# Altium footprint library Intelliclone.PcbLib: 372 footprints (part 13 of 24)
Each footprint in its own frame and in the unit in brackets; x right, y up, seen from the top. Pads: shape width x height; smd on the part's side, far side on the other; paste and mask are expansions set on the pad; w line width, h text height; cw(c..) or ccw(c..) is an arc to the next point about the centre after c.
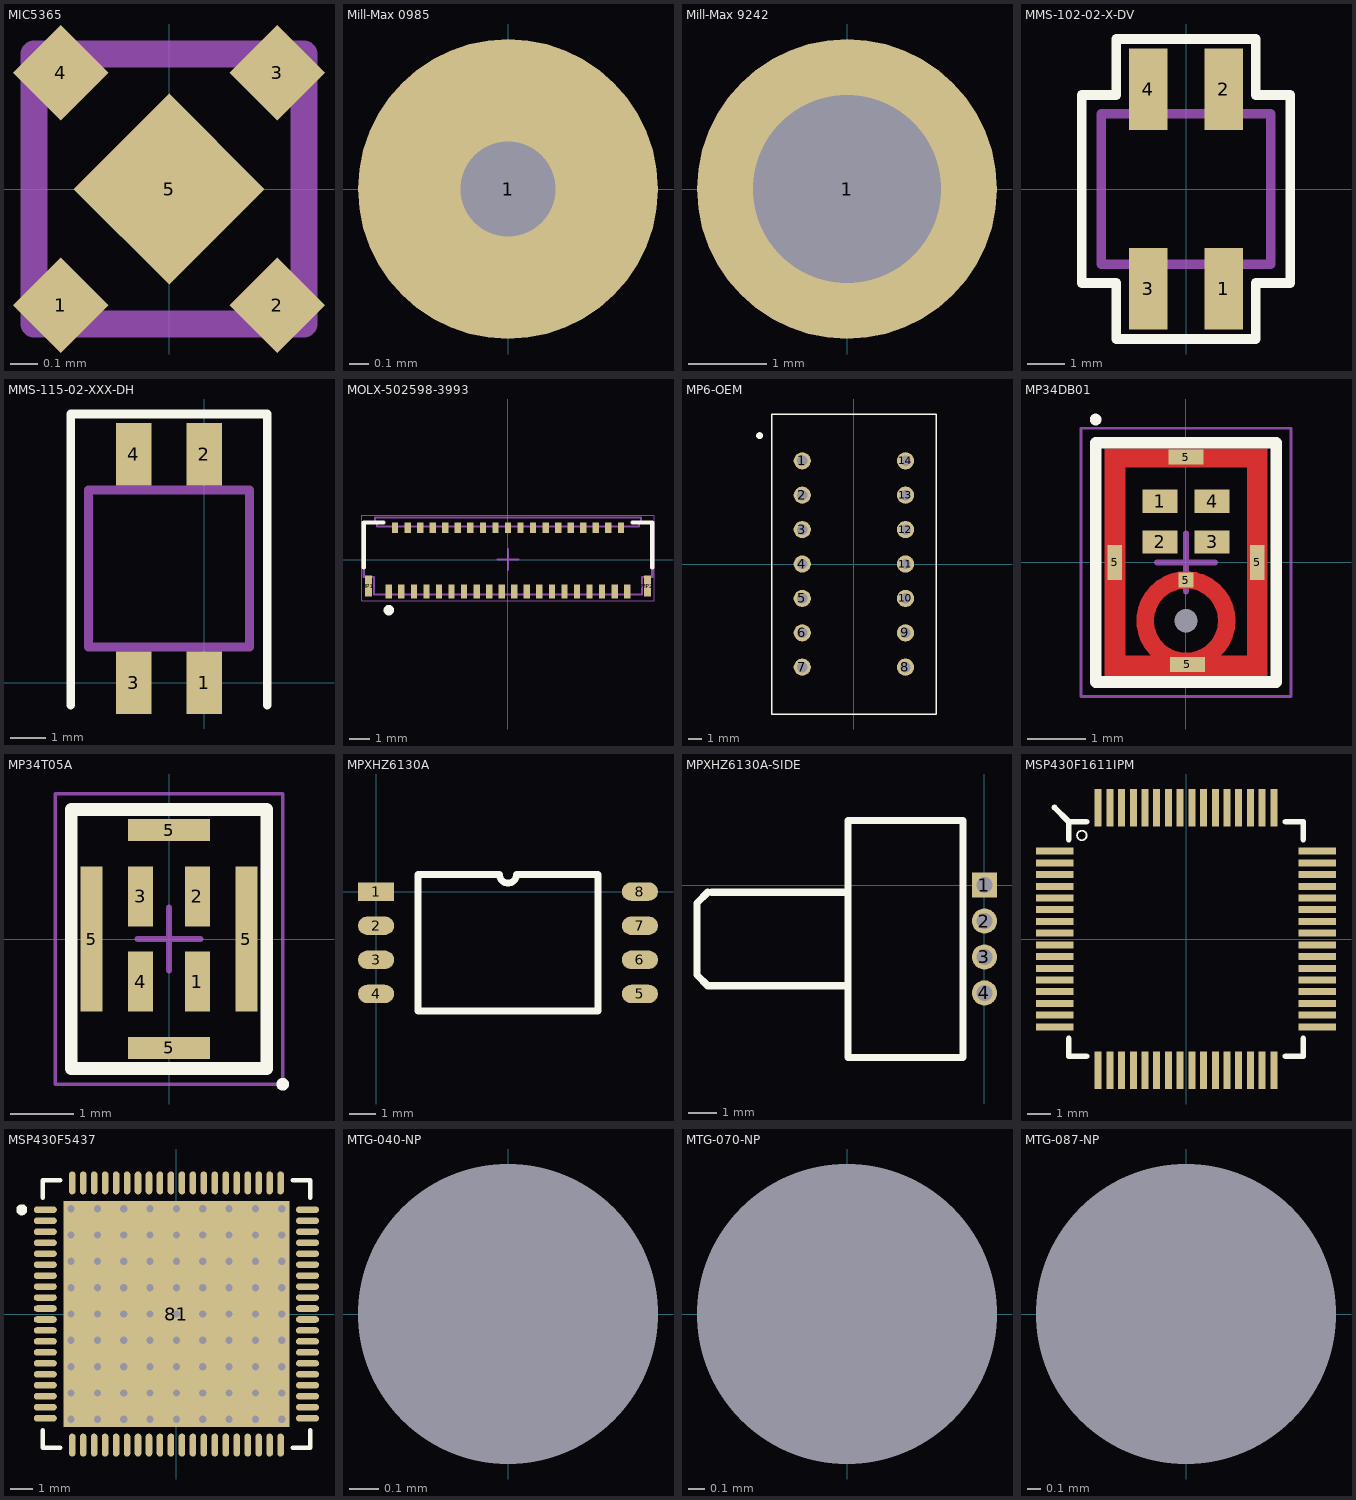
[diagram p12: the footprints below, top view; thin cyan lines are the x and y axes]

## MIC5365 [mm]
pads (5):
  rrect0% 0.25x0.25 smd rot 45: 1(-0.4,-0.43) 2(0.4,-0.43) 3(0.4,0.43) 4(-0.4,0.43)
  rrect0% 0.5x0.5 smd rot 45: 5(0,0)
Mechanical 1:
  lines w0.1: -0.5,-0.5 0.5,-0.5 0.5,0.5 -0.5,0.5 -0.5,-0.5
  text "U2" at 1.664,0.375 h0.51

## Mill-Max 0985 [mil] "CONTACT SPRING LOADED T/H GOLD"
pads (1):
  round 60 hole 19: 1(0,0)
3D body "mill-max-0985-0-15-20-71-14-11-0.step": height 247, standoff -103, extent -21.49,-21.49 21.51,21.51

## Mill-Max 9242 [mil] "CONN PC PIN CIRC .083 DIA TIN"
pads (1):
  round 150 hole 94: 1(0,0)
3D body "mill-max-9242-0-00-01-00-00-08-0.step": height 400, standoff -94, extent -62.49,-62.49 62.51,62.51

## MMS-102-02-X-DV [mm] "Samtec MMS-102-02-X-DV"
pads (4):
  rect 1.02x2.16 smd mask+0.05: 1(1,-2.655) 2(1,2.655) 3(-1,-2.655) 4(-1,2.655)
Top Overlay:
  lines w0.254: -2.775,-2.5 -2.775,2.5 -1.85,2.5 -1.85,3.989 1.85,3.989 1.85,2.5 2.775,2.5 2.775,-2.5 1.85,-2.5 1.85,-3.989 -1.85,-3.989 -1.85,-2.5 -2.775,-2.5
Mechanical 1:
  lines w0.254: -2.25,-2 -2.25,2 2.25,2 2.25,-2 -2.25,-2
3D body "MMS-102-02-S-DV-TR.stp": height 4.44, standoff -0.05, extent -2.278,-3.218 2.279,3.218

## MMS-115-02-XXX-DH [mil]
pads (4):
  rect 40x70 smd mask+2: 1(0,0) 2(0,255) 3(-78.74,0) 4(-78.74,255)
Top Overlay:
  lines w10: -149.09,-25 -149.09,300 70.37,300 70.37,-25
Mechanical 1:
  lines w10: -129.09,40 50.37,40 50.37,215 -129.09,215 -129.09,40
  text "J1" at -51.18,118.11 h30
3D body "MMS-102-02-S-DH.stp": height 165.27, standoff 0.87, extent -129.69,-14.99 49.71,270.01

## MOLX-502598-3993 [mm] "FPC Connector, 39-Leads, Right Angle, Pitch 0.3 mm, Mated Height 1.15 mm, SMT"
height 1.162
pads (41):
  rect 0.3x0.67 smd: 1(-5.7,-1.532) 3(-5.1,-1.532) 5(-4.5,-1.532) 7(-3.9,-1.532) 9(-3.3,-1.532) 11(-2.7,-1.532) 13(-2.1,-1.532) 15(-1.5,-1.532) 17(-0.9,-1.532) 19(-0.3,-1.532) 21(0.3,-1.532) 23(0.9,-1.532) 25(1.5,-1.532) 27(2.1,-1.532) 29(2.7,-1.532) 31(3.3,-1.532) 33(3.9,-1.532) 35(4.5,-1.532) 37(5.1,-1.532) 39(5.7,-1.532)
  rect 0.3x0.5 smd: 2(-5.4,1.533) 4(-4.8,1.533) 6(-4.2,1.533) 8(-3.6,1.533) 10(-3,1.533) 12(-2.4,1.533) 14(-1.8,1.533) 16(-1.2,1.533) 18(-0.6,1.533) 20(0,1.533) 22(0.6,1.533) 24(1.2,1.533) 26(1.8,1.533) 28(2.4,1.533) 30(3,1.533) 32(3.6,1.533) 34(4.2,1.533) 36(4.8,1.533) 38(5.4,1.533)
  rect 0.35x1 smd: MP1(-6.675,-1.267) MP2(6.675,-1.267)
Top Overlay:
  circle w0.25: c-5.7,-2.417 r0.125
  lines w0.2: -6.9,-0.37 -6.9,1.775 -5.95,1.775 ; 5.95,1.775 6.9,1.775 6.9,-0.37
Mechanical 13:
  lines w0.1: -6.37,1.775 -6.37,2.025 6.37,2.025 6.37,1.775 ; 6.27,1.775 6.9,1.775 ; 6.27,1.775 6.27,1.575 -6.27,1.575 -6.27,1.775 -6.9,1.775 -6.9,-0.825 -6.4,-0.825 -6.4,-1.667 6.4,-1.667 6.4,-0.825 6.9,-0.825 6.9,1.775
Mechanical 15:
  lines w0.05: -7,-1.967 -7,2.125 7,2.125 7,-1.967 -7,-1.967
  lines w0.1: -0.5,0 0.5,0 ; 0,-0.5 0,0.5
3D body "5025983993.stp": height 1.16, standoff 0.01, extent -6.9,-1.775 6.9,2.025

## MP6-OEM [mil] "MP6 Pump Driver Module"
pads (14):
  round 50 hole 30: 1(-150,300) 2(-150,200) 3(-150,100) 4(-150,0) 5(-150,-100) 6(-150,-200) 7(-150,-300) 8(150,-300) 9(150,-200) 10(150,-100) 11(150,0) 12(150,100) 13(150,200) 14(150,300)
Top Overlay:
  circle w10: c-274,373 r5
  lines w4.02: -239,-436 -239,436 239,436 239,-436 -239,-436
3D body: height 230, standoff 4, extent -239,-436 239,436

## MP34DB01 [mm] "DFN, 4-Leads, Body 4.00x3.00mm, Pitch 0.70mm, IPC Medium Density"
height 1
pads (10):
  round 0 hole 0.4 unplated: 0(0,-1)
  rect 0.6x0.4 smd: 1(-0.45,1.05) 2(-0.45,0.35) 3(0.45,0.35) 4(0.45,1.05)
  rect 0.254x0.6 smd paste-3 mask-3: 5(-1.222,0) 5(1.222,0)
  rect 0.254x0.254 smd paste-3 mask-3: 5(0,-0.302)
  rect 0.6x0.254 smd paste-3 mask-3: 5(0,1.806) 5(0.025,-1.75)
Top Layer:
  circle w0.3: c0,-1 r0.7
  rectangle: 1.048,-1.95 1.4,1.95
  rectangle: -1.4,-1.95 1.4,-1.6
  rectangle: -1.4,-1.95 -1.041,1.95
  rectangle: -1.4,1.629 1.4,1.95
  rectangle: -0.711,1.625 0.7,1.95
  rectangle: 1.05,-1.95 1.4,1.139
  rectangle: -1.394,-1.951 -1.044,1.146
Top Overlay:
  circle w0.1: c-1.55,2.45 r0.05
  lines w0.2: -1.55,-2.05 -1.55,2.05 1.55,2.05 1.55,-2.05 -1.55,-2.05
Top Paste:
  rectangle: 1.051,0.947 1.401,1.163
  rectangle: -1.406,0.95 -1.056,1.167
  region: -0.8,-1.6 -0.8,-1.95 0.85,-1.95 0.85,-1.6
  region: 1.4,-1.25 1.05,-1.25 1.05,-1.95 1.4,-1.95
  region: -1.05,-1.25 -1.4,-1.25 -1.4,-1.95 -1.05,-1.95
  region: 0.752,1.625 0.752,1.95 -0.763,1.95 -0.763,1.625
  rectangle: 1.052,0.95 1.4,1.95
  rectangle: -1.415,0.95 -1.052,1.95
  rectangle: 1.05,-0.65 1.4,0.65
  rectangle: -1.4,-0.65 -1.05,0.65
  lines w0.3: -0.696,-1.072 cw(c0,-1) -0.282,-0.359 ; -0.482,-1.508 ccw(c0,-1) 0.525,-1.463 ; 0.293,-0.364 cw(c0,-1) 0.697,-1.061
Mechanical 13:
  lines w0.1: -1.55,-2.05 1.55,-2.05 1.55,2.05 -1.55,2.05 -1.55,-2.05
Mechanical 15:
  lines w0.05: -1.8,-2.3 1.8,-2.3 1.8,2.3 -1.8,2.3 -1.8,-2.3
  lines w0.1: -0.5,0 0.5,0 ; 0,-0.5 0,0.5
3D body: height 1, standoff 0.05, extent -1.55,-2.05 1.55,2.05

## MP34T05A [mm]
pads (8):
  rect 0.4x0.95 smd: 1(0.45,-0.675) 2(0.45,0.675) 3(-0.45,0.675) 4(-0.45,-0.675)
  rect 0.35x2.3 smd: 5(-1.225,0) 5(1.225,0)
  rect 1.3x0.35 smd: 5(0,-1.725) 5(0,1.725)
Top Overlay:
  circle w0.1: c1.8,-2.3 r0.05
  lines w0.2: -1.55,-2.05 1.55,-2.05 1.55,2.05 -1.55,2.05 -1.55,-2.05
Mechanical 13:
  lines w0.1: -1.55,-2.05 -1.55,2.05 1.55,2.05 1.55,-2.05 -1.55,-2.05
Mechanical 15:
  lines w0.05: -1.8,-2.3 -1.8,2.3 1.8,2.3 1.8,-2.3 -1.8,-2.3
  lines w0.1: -0.5,0 0.5,0 ; 0,-0.5 0,0.5
3D body: height 1, standoff 0.05, extent -1.55,-2.05 1.55,2.05

## MPXHZ6130A [mil] "SENSOR PRESSURE AXIAL PORT 8SSOP"
pads (8):
  rect 53x27 smd: 1(0,0)
  oval 53x27 smd: 2(0,-50) 3(0,-100) 4(0,-150) 5(387,-150) 6(387,-100) 7(387,-50) 8(387,0)
Top Overlay:
  lines w10: 61.5,-175 325.5,-175 325.5,25 206,25 cw(c193.5,25) 181,25 61.5,25 61.5,-175

## MPXHZ6130A-SIDE [mil] "SENSOR PRESSURE AXIAL PORT 8SSOP - 90 Degrees"
pads (4):
  rect 35x35 hole 22: 1(0,0)
  round 35 hole 22: 2(0,-50) 3(0,-100) 4(0,-150)
Top Overlay:
  lines w10: -385,-10 -400,-25 -400,-125 -385,-140 -380,-140 -190,-140 ; -380,-10 -190,-10 ; -190,-240 -30,-240 -30,90 -190,90 -190,-240
3D body: height 335, standoff 0, extent -188.98,-240.16 -27.56,90.55
3D body: height 119.53, standoff 0, extent -382.4,-135.51 -192.4,-15.75

## MSP430F1611IPM [mil]
pads (64):
  rect 63x11.8 smd: 1(-220.5,147.6) 2(-220.5,128) 3(-220.5,108.3) 4(-220.5,88.6) 5(-220.5,68.9) 6(-220.5,49.2) 7(-220.5,29.5) 8(-220.5,9.8) 9(-220.5,-9.8) 10(-220.5,-29.5) 11(-220.5,-49.2) 12(-220.5,-68.9) 13(-220.5,-88.6) 14(-220.5,-108.3) 15(-220.5,-128) 16(-220.5,-147.6) 33(220.5,-147.6) 34(220.5,-128) 35(220.5,-108.3) 36(220.5,-88.6) 37(220.5,-68.9) 38(220.5,-49.2) 39(220.5,-29.5) 40(220.5,-9.8) 41(220.5,9.8) 42(220.5,29.5) 43(220.5,49.2) 44(220.5,68.9) 45(220.5,88.6) 46(220.5,108.3) 47(220.5,128) 48(220.5,147.6)
  rect 11.8x63 smd: 17(-147.6,-220.5) 18(-128,-220.5) 19(-108.3,-220.5) 20(-88.6,-220.5) 21(-68.9,-220.5) 22(-49.2,-220.5) 23(-29.5,-220.5) 24(-9.8,-220.5) 25(9.8,-220.5) 26(29.5,-220.5) 27(49.2,-220.5) 28(68.9,-220.5) 29(88.6,-220.5) 30(108.3,-220.5) 31(128,-220.5) 32(147.6,-220.5) 49(147.6,220.5) 50(128,220.5) 51(108.3,220.5) 52(88.6,220.5) 53(68.9,220.5) 54(49.2,220.5) 55(29.5,220.5) 56(9.8,220.5) 57(-9.8,220.5) 58(-29.5,220.5) 59(-49.2,220.5) 60(-68.9,220.5) 61(-88.6,220.5) 62(-108.3,220.5) 63(-128,220.5) 64(-147.6,220.5)
Top Overlay:
  circle w3: c-174.92,174 r8
  lines w9.8: -197,-167 -197,-197 -167,-197 ; -197,167 -197,197 -167,197 ; 167,-197 197,-197 197,-167 ; 167,197 197,197 197,167
  lines w10: -221,221 -197.73,197.73
3D body: height 55.11, standoff 4, extent -198,-196 198,196

## MSP430F5437 [mm]
pads (81):
  oval 1.05x0.3 smd: 1(-5.975,4.75) 2(-5.975,4.25) 3(-5.975,3.75) 4(-5.975,3.25) 5(-5.975,2.75) 6(-5.975,2.25) 7(-5.975,1.75) 8(-5.975,1.25) 9(-5.975,0.75) 10(-5.975,0.25) 11(-5.975,-0.25) 12(-5.975,-0.75) 13(-5.975,-1.25) 14(-5.975,-1.75) 15(-5.975,-2.25) 16(-5.975,-2.75) 17(-5.975,-3.25) 18(-5.975,-3.75) 19(-5.975,-4.25) 20(-5.975,-4.75) 41(5.975,-4.75) 42(5.975,-4.25) 43(5.975,-3.75) 44(5.975,-3.25) 45(5.975,-2.75) 46(5.975,-2.25) 47(5.975,-1.75) 48(5.975,-1.25) 49(5.975,-0.75) 50(5.975,-0.25) 51(5.975,0.25) 52(5.975,0.75) 53(5.975,1.25) 54(5.975,1.75) 55(5.975,2.25) 56(5.975,2.75) 57(5.975,3.25) 58(5.975,3.75) 59(5.975,4.25) 60(5.975,4.75)
  oval 0.3x1.05 smd: 21(-4.75,-5.975) 22(-4.25,-5.975) 23(-3.75,-5.975) 24(-3.25,-5.975) 25(-2.75,-5.975) 26(-2.25,-5.975) 27(-1.75,-5.975) 28(-1.25,-5.975) 29(-0.75,-5.975) 30(-0.25,-5.975) 31(0.25,-5.975) 32(0.75,-5.975) 33(1.25,-5.975) 34(1.75,-5.975) 35(2.25,-5.975) 36(2.75,-5.975) 37(3.25,-5.975) 38(3.75,-5.975) 39(4.25,-5.975) 40(4.75,-5.975) 61(4.75,5.975) 62(4.25,5.975) 63(3.75,5.975) 64(3.25,5.975) 65(2.75,5.975) 66(2.25,5.975) 67(1.75,5.975) 68(1.25,5.975) 69(0.75,5.975) 70(0.25,5.975) 71(-0.25,5.975) 72(-0.75,5.975) 73(-1.25,5.975) 74(-1.75,5.975) 75(-2.25,5.975) 76(-2.75,5.975) 77(-3.25,5.975) 78(-3.75,5.975) 79(-4.25,5.975) 80(-4.75,5.975)
  rect 10.3x10.3 smd: 81(0,0)
via -4.8,4.8 diameter 0.66 hole 0.33
via -3.6,4.8 diameter 0.66 hole 0.33
via -2.4,4.8 diameter 0.66 hole 0.33
via -1.2,4.8 diameter 0.66 hole 0.33
via 0,4.8 diameter 0.66 hole 0.33
via 1.2,4.8 diameter 0.66 hole 0.33
via 2.4,4.8 diameter 0.66 hole 0.33
via 3.6,4.8 diameter 0.66 hole 0.33
via 4.8,4.8 diameter 0.66 hole 0.33
via -4.8,3.6 diameter 0.66 hole 0.33
via -3.6,3.6 diameter 0.66 hole 0.33
via -2.4,3.6 diameter 0.66 hole 0.33
via -1.2,3.6 diameter 0.66 hole 0.33
via 0,3.6 diameter 0.66 hole 0.33
via 1.2,3.6 diameter 0.66 hole 0.33
via 2.4,3.6 diameter 0.66 hole 0.33
via 3.6,3.6 diameter 0.66 hole 0.33
via 4.8,3.6 diameter 0.66 hole 0.33
via -4.8,2.4 diameter 0.66 hole 0.33
via -3.6,2.4 diameter 0.66 hole 0.33
via -2.4,2.4 diameter 0.66 hole 0.33
via -1.2,2.4 diameter 0.66 hole 0.33
via 0,2.4 diameter 0.66 hole 0.33
via 1.2,2.4 diameter 0.66 hole 0.33
via 2.4,2.4 diameter 0.66 hole 0.33
via 3.6,2.4 diameter 0.66 hole 0.33
via 4.8,2.4 diameter 0.66 hole 0.33
via -4.8,1.2 diameter 0.66 hole 0.33
via -3.6,1.2 diameter 0.66 hole 0.33
via -2.4,1.2 diameter 0.66 hole 0.33
via -1.2,1.2 diameter 0.66 hole 0.33
via 0,1.2 diameter 0.66 hole 0.33
via 1.2,1.2 diameter 0.66 hole 0.33
via 2.4,1.2 diameter 0.66 hole 0.33
via 3.6,1.2 diameter 0.66 hole 0.33
via 4.8,1.2 diameter 0.66 hole 0.33
via -4.8,0 diameter 0.66 hole 0.33
via -3.6,0 diameter 0.66 hole 0.33
via -2.4,0 diameter 0.66 hole 0.33
via -1.2,0 diameter 0.66 hole 0.33
via 0,0 diameter 0.66 hole 0.33
via 1.2,0 diameter 0.66 hole 0.33
via 2.4,0 diameter 0.66 hole 0.33
via 3.6,0 diameter 0.66 hole 0.33
via 4.8,0 diameter 0.66 hole 0.33
via -4.8,-1.2 diameter 0.66 hole 0.33
via -3.6,-1.2 diameter 0.66 hole 0.33
via -2.4,-1.2 diameter 0.66 hole 0.33
via -1.2,-1.2 diameter 0.66 hole 0.33
via 0,-1.2 diameter 0.66 hole 0.33
via 1.2,-1.2 diameter 0.66 hole 0.33
via 2.4,-1.2 diameter 0.66 hole 0.33
via 3.6,-1.2 diameter 0.66 hole 0.33
via 4.8,-1.2 diameter 0.66 hole 0.33
via -4.8,-2.4 diameter 0.66 hole 0.33
via -3.6,-2.4 diameter 0.66 hole 0.33
via -2.4,-2.4 diameter 0.66 hole 0.33
via -1.2,-2.4 diameter 0.66 hole 0.33
via 0,-2.4 diameter 0.66 hole 0.33
via 1.2,-2.4 diameter 0.66 hole 0.33
via 2.4,-2.4 diameter 0.66 hole 0.33
via 3.6,-2.4 diameter 0.66 hole 0.33
via 4.8,-2.4 diameter 0.66 hole 0.33
via -4.8,-3.6 diameter 0.66 hole 0.33
via -3.6,-3.6 diameter 0.66 hole 0.33
via -2.4,-3.6 diameter 0.66 hole 0.33
via -1.2,-3.6 diameter 0.66 hole 0.33
via 0,-3.6 diameter 0.66 hole 0.33
via 1.2,-3.6 diameter 0.66 hole 0.33
via 2.4,-3.6 diameter 0.66 hole 0.33
via 3.6,-3.6 diameter 0.66 hole 0.33
via 4.8,-3.6 diameter 0.66 hole 0.33
via -4.8,-4.8 diameter 0.66 hole 0.33
via -3.6,-4.8 diameter 0.66 hole 0.33
via -2.4,-4.8 diameter 0.66 hole 0.33
via -1.2,-4.8 diameter 0.66 hole 0.33
via 0,-4.8 diameter 0.66 hole 0.33
via 1.2,-4.8 diameter 0.66 hole 0.33
via 2.4,-4.8 diameter 0.66 hole 0.33
via 3.6,-4.8 diameter 0.66 hole 0.33
via 4.8,-4.8 diameter 0.66 hole 0.33
Top Overlay:
  circle w0.25: c-7.05,4.75 r0.125
  lines w0.2: -6.1,-5.3 -6.1,-6.1 -5.3,-6.1 ; -6.1,5.3 -6.1,6.1 -5.3,6.1 ; 5.3,-6.1 6.1,-6.1 6.1,-5.3 ; 5.3,6.1 6.1,6.1 6.1,5.3
3D body: height 1, standoff 0, extent -6.075,-6.075 6.075,6.075

## MTG-040-NP [mil] "Non-plated .040\" hole"
pads (1):
  round 0 hole 40 unplated paste+0 mask+0: 1(0,0)

## MTG-070-NP [mil] "Non-plated .070\" hole"
pads (1):
  round 0 hole 70 unplated paste+0 mask+0: 1(0,0)

## MTG-087-NP [mil] "Non-plated .087\" hole"
pads (1):
  round 0 hole 87 unplated paste+0 mask+0: 1(0,0)